# Altium footprint library 3D_MIG_Controller.PCBLIB: 560 footprints (part 31 of 35)
Each footprint in its own frame and in the unit in brackets; x right, y up, seen from the top. Pads: shape width x height; smd on the part's side, far side on the other; paste and mask are expansions set on the pad; w line width, h text height; cw(c..) or ccw(c..) is an arc to the next point about the centre after c.
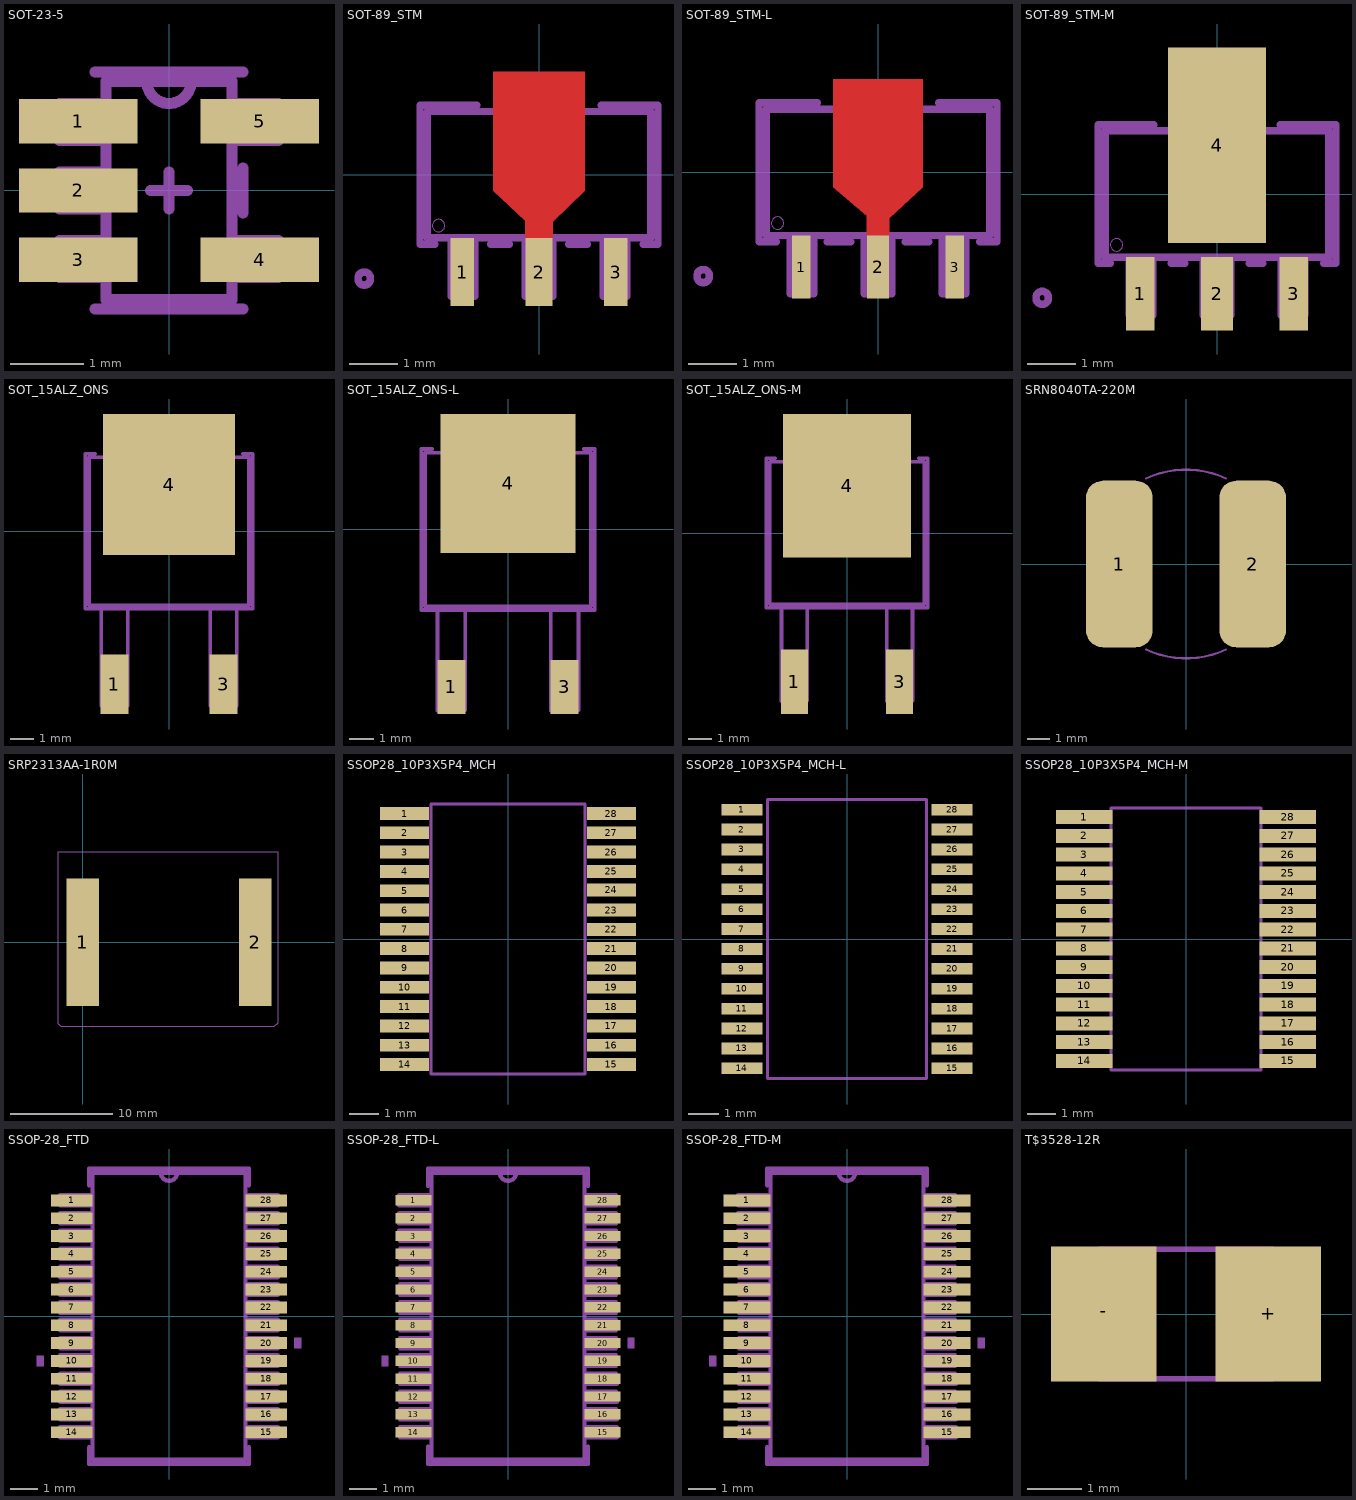
[diagram p30: the footprints below, top view; thin cyan lines are the x and y axes]

## SOT-23-5 [mil]
pads (5):
  rect 64x24 smd: 1(-49,37.4) 2(-49,0) 3(-49,-37.4) 4(49,-37.4) 5(49,37.4)
tDocu:
  lines w6: -34,-47 -34,-59 34,-59 34,-27 ; -34,-47 -34,-27 ; -34,-47 -59,-47 -59,-27 -34,-27 ; -34,-27 -34,-10 ; -34,-10 -34,27 ; -34,-10 -35,10 -59,10 -59,-10 -34,-10 ; -34,27 -34,59 -12,59 ; -34,27 -35,47 -59,47 -59,27 -34,27 ; -12,59 12,59 ; -12,59 ccw(c0,59) 12,59 ; 12,59 34,59 34,47 ; 34,-27 34,27 ; 34,-27 35,-47 59,-47 59,-27 34,-27 ; 34,27 34,47 ; 34,27 59,27 59,47 34,47
  text "*" at -47,18 h62
tPlace:
  lines w6: -40,-64 40,-64 ; -40,64 40,64 ; 40,-12 40,12
  text "*" at -82,56 h62
tOrigins:
  lines w6: -10,0 10,0 ; 0,-10 0,10

## SOT-89_STM [mil]
pads (3):
  rect 19x55 smd: 1(-61.81,-78.5) 3(61.81,-78.5)
  rect 22x55 smd: 2(0,-78.5)
Top:
  region: -11,-51 -11,-37 -37,-13 -37,83 37,83 37,-13 11,-38 11,-51
Top Paste:
  region: -11,-51 -11,-37 -36,-12 -36,77 36,77 36,-12 11,-37 11,-51
Top Solder:
  region: -11,-51 -11,-37 -36,-12 -36,77 36,77 36,-12 11,-37 11,-51
tDocu:
  lines w0: -86,-41 ccw(c-81,-41) -76,-41 ccw(c-81,-41) -86,-41
  lines w6: -90,-51 90,-51 90,51 -90,51 -90,-51 ; -71,-98 -71,-51 -52,-51 -52,-98 -71,-98 ; -11,-98 -11,-51 11,-51 11,-98 -11,-98 ; 52,-98 52,-51 71,-51 71,-98 52,-98
tPlace:
  lines w6: -136,-84 cw(c-141,-84) -146,-84 cw(c-141,-83.5) -136,-83 ; -84,-56 -96,-56 -96,56 -50,56 ; -39,-56 -24,-56 ; 24,-56 39,-56 ; 50,56 96,56 96,-56 84,-56

## SOT-89_STM-L [mil]
pads (3):
  rect 15x51 smd: 1(-61.81,-76.5) 3(61.81,-76.5)
  rect 18x51 smd: 2(0,-76.5)
Top:
  region: -9,-51 -9,-35 -36,-12 -36,75 36,75 36,-12 9,-37 9,-51
Top Paste:
  region: -9,-49 -9,-35 -34,-10 -34,73 34,73 34,-10 9,-35 9,-49
Top Solder:
  region: -9,-49 -9,-35 -34,-10 -34,73 34,73 34,-10 9,-35 9,-49
tDocu:
  lines w0: -86,-41 ccw(c-81,-41) -76,-41 ccw(c-81,-41) -86,-41
  lines w6: -90,-51 90,-51 90,51 -90,51 -90,-51 ; -71,-98 -71,-51 -52,-51 -52,-98 -71,-98 ; -11,-98 -11,-51 11,-51 11,-98 -11,-98 ; 52,-98 52,-51 71,-51 71,-98 52,-98
tPlace:
  lines w6: -136,-84 cw(c-141,-84) -146,-84 cw(c-141,-83.5) -136,-83 ; -82,-56 -96,-56 -96,56 -49,56 ; -41,-56 -22,-56 ; 22,-56 41,-56 ; 49,56 96,56 96,-56 82,-56

## SOT-89_STM-M [mil]
pads (4):
  rect 23x59 smd: 1(-61.81,-80.5) 3(61.81,-80.5)
  rect 26x59 smd: 2(0,-80.5)
  rect 78.74x157.48 smd: 4(0,39.37)
Top Paste:
  region: -13,-53 -13,-39 -38,-14 -38,81 38,81 38,-14 13,-39 13,-53
Top Solder:
  region: -13,-53 -13,-39 -38,-14 -38,81 38,81 38,-14 13,-39 13,-53
tDocu:
  lines w0: -86,-41 ccw(c-81,-41) -76,-41 ccw(c-81,-41) -86,-41
  lines w6: -90,-51 90,-51 90,51 -90,51 -90,-51 ; -71,-98 -71,-51 -52,-51 -52,-98 -71,-98 ; -11,-98 -11,-51 11,-51 11,-98 -11,-98 ; 52,-98 52,-51 71,-51 71,-98 52,-98
tPlace:
  lines w6: -136,-84 cw(c-141,-84) -146,-84 cw(c-141,-83.5) -136,-83 ; -86,-56 -96,-56 -96,56 -51,56 ; -37,-56 -26,-56 ; 26,-56 37,-56 ; 51,56 96,56 96,-56 86,-56

## SOT_15ALZ_ONS [mil]
pads (3):
  rect 46x98 smd: 1(-89.96,-252.5) 3(89.96,-252.5)
  rect 217x233 smd: 4(0,77)
tDocu:
  lines w6: -132,-122 132,-122 132,122 -132,122 -132,-122 ; -112,-288 -112,-122 -68,-122 -68,-288 -112,-288 ; 68,-288 68,-122 112,-122 112,-288 68,-288
  text "*" at -113,-138 h77.5
tPlace:
  lines w6: -122,128 -138,128 -138,-128 138,-128 138,128 122,128 ; -112,-190 -112,-146 ; -68,-190 -68,-146 ; 68,-190 68,-146 ; 112,-190 112,-146
  text "*" at -228,-278 h77.5

## SOT_15ALZ_ONS-L [mil]
pads (3):
  rect 44x86 smd: 1(-89.96,-250.5) 3(89.96,-250.5)
  rect 215x221 smd: 4(0,73)
tDocu:
  lines w6: -132,-122 132,-122 132,122 -132,122 -132,-122 ; -112,-288 -112,-123 -68,-122 -68,-287 -112,-288 ; 68,-288 68,-123 112,-122 112,-287 68,-288
  text "*" at -113,-138 h77.5
tPlace:
  lines w6: -121,128 -138,128 -138,-128 138,-128 138,128 121,128 ; -112,-194 -112,-146 ; -68,-194 -68,-146 ; 68,-194 68,-146 ; 112,-194 112,-146
  text "*" at -228,-276 h77.5

## SOT_15ALZ_ONS-M [mil]
pads (3):
  rect 46x110 smd: 1(-89.96,-254.5) 3(89.96,-254.5)
  rect 219x245 smd: 4(0,81)
tDocu:
  lines w6: -132,-122 132,-122 132,122 -132,122 -132,-122 ; -112,-288 -112,-123 -68,-122 -68,-287 -112,-288 ; 68,-288 68,-123 112,-122 112,-287 68,-288
  text "*" at -113,-138 h77.5
tPlace:
  lines w6: -123,128 -138,128 -138,-128 138,-128 138,128 123,128 ; -112,-186 -112,-146 ; -68,-186 -68,-146 ; 68,-186 68,-146 ; 112,-186 112,-146
  text "*" at -228,-280 h77.5

## SRN8040TA-220M [mm]
pads (2):
  rrect50% 3x7.5 smd: 1(-3,0) 2(3,0)
tPlace:
  lines w0.1: -1.796,3.852 cw(c0,0) 1.796,3.852 ; -1.792,-3.85 ccw(c0.004,0.002) 1.8,-3.85

## SRP2313AA-1R0M [mil]
pads (2):
  rect 124.02x492.13 smd: 1(0,0) 2(666.34,0)
tPlace:
  lines w3.94: -95,-315 -85,-325 740,-325 755,-310 755,350 -95,350 -95,-315

## SSOP28_10P3X5P4_MCH [mil]
pads (28):
  rect 65x17 smd: 1(-137,166.34) 2(-137,140.75) 3(-137,115.16) 4(-137,89.57) 5(-137,63.98) 6(-137,38.39) 7(-137,13) 8(-137,-12.8) 9(-137,-38.39) 10(-137,-63.98) 11(-137,-89.57) 12(-137,-115.16) 13(-137,-140.75) 14(-137,-166.34) 15(137,-166.34) 16(137,-140.75) 17(137,-115.16) 18(137,-89.57) 19(137,-63.98) 20(137,-38.39) 21(137,-12.8) 22(137,12.8) 23(137,38.39) 24(137,65) 25(137,89.57) 26(137,115.16) 27(137,140.75) 28(137,166.34)
tPlace:
  lines w3.94: -102.36,-179.13 -102.36,179.13 102.36,179.13 102.36,-179.13 -102.36,-179.13
  text "*" at -39.27,141.02 h77.5

## SSOP28_10P3X5P4_MCH-L [mil]
pads (28):
  rect 53x15 smd: 1(-135,166.34) 2(-135,140.75) 3(-135,115.16) 4(-135,89.57) 5(-135,63.98) 6(-135,38.39) 7(-135,12.8) 8(-135,-12.8) 9(-135,-38.39) 10(-135,-63.98) 11(-135,-89.57) 12(-135,-115.16) 13(-135,-140.75) 14(-135,-166.34) 15(135,-166.34) 16(135,-140.75) 17(135,-115.16) 18(135,-89.57) 19(135,-63.98) 20(135,-38.39) 21(135,-12.8) 22(135,12.8) 23(135,38.39) 24(135,63.98) 25(135,89.57) 26(135,115.16) 27(135,140.75) 28(135,166.34)
tPlace:
  lines w3.94: -102.36,-179.13 -102.36,179.13 102.36,179.13 102.36,-179.13 -102.36,-179.13
  text "*" at -37.27,135.15 h77.5

## SSOP28_10P3X5P4_MCH-M [mil]
pads (28):
  rect 77x19 smd: 1(-139,166.34) 2(-139,140.75) 3(-139,115.16) 4(-139,89.57) 5(-139,63.98) 6(-139,38.39) 7(-139,12.8) 8(-139,-12.8) 9(-139,-38.39) 10(-139,-63.98) 11(-139,-89.57) 12(-139,-115.16) 13(-139,-140.75) 14(-139,-166.34) 15(139,-166.34) 16(139,-140.75) 17(139,-115.16) 18(139,-89.57) 19(139,-63.98) 20(139,-38.39) 21(139,-12.8) 22(139,12.8) 23(139,38.39) 24(139,63.98) 25(139,89.57) 26(139,115.16) 27(139,140.75) 28(139,166.34)
tPlace:
  lines w3.94: -102.36,-179.13 -102.36,179.13 102.36,179.13 102.36,-179.13 -102.36,-179.13
  text "*" at -35.36,137.06 h77.5

## SSOP-28_FTD [mil]
pads (28):
  rect 59.5x17 smd: 1(-139.75,166.34) 2(-139.75,140.75) 3(-139.75,115.16) 4(-139.75,89.57) 5(-139.75,63.98) 6(-139.75,38.39) 7(-139.75,12.8) 8(-139.75,-12.8) 9(-139.75,-38.39) 10(-139.75,-63.98) 11(-139.75,-89.57) 12(-139.75,-115.16) 13(-139.75,-140.75) 14(-139.75,-166.34) 15(139.75,-166.34) 16(139.75,-140.75) 17(139.75,-115.16) 18(139.75,-89.57) 19(139.75,-63.98) 20(139.75,-38.39) 21(139.75,-12.8) 22(139.75,12.8) 23(139.75,38.39) 24(139.75,63.98) 25(139.75,89.57) 26(139.75,115.16) 27(139.75,140.75) 28(139.75,166.34)
tDocu:
  lines w6: 12,207 cw(c0,206.5) -12,206 ; -12,206 110,206 110,-206 -110,-206 -110,206 -12,206 ; -156,-174 -156,-159 -110,-159 -110,-174 -156,-174 ; -156,-148 -156,-133 -110,-133 -110,-148 -156,-148 ; -156,-123 -156,-108 -110,-108 -110,-123 -156,-123 ; -156,-97 -156,-82 -110,-82 -110,-97 -156,-97 ; -156,-71 -156,-56 -110,-56 -110,-71 -156,-71 ; -156,-46 -156,-31 -110,-31 -110,-46 -156,-46 ; -156,-20 -156,-5 -110,-5 -110,-20 -156,-20 ; -156,5 -156,20 -110,20 -110,5 -156,5 ; -156,31 -156,46 -110,46 -110,31 -156,31 ; -156,56 -156,71 -110,71 -110,56 -156,56 ; -156,82 -156,97 -110,97 -110,82 -156,82 ; -156,108 -156,123 -110,123 -110,108 -156,108 ; -156,133 -156,148 -110,148 -110,133 -156,133 ; -156,159 -156,174 -110,174 -110,159 -156,159 ; 110,-174 110,-159 156,-159 156,-174 110,-174 ; 110,-148 110,-133 156,-133 156,-148 110,-148 ; 110,-123 110,-108 156,-108 156,-123 110,-123 ; 110,-97 110,-82 156,-82 156,-97 110,-97 ; 110,-71 110,-56 156,-56 156,-71 110,-71 ; 110,-46 110,-31 156,-31 156,-46 110,-46 ; 110,-20 110,-5 156,-5 156,-20 110,-20 ; 110,5 110,20 156,20 156,5 110,5 ; 110,31 110,46 156,46 156,31 110,31 ; 110,56 110,71 156,71 156,56 110,56 ; 110,82 110,97 156,97 156,82 110,82 ; 110,108 110,123 156,123 156,108 110,108 ; 110,133 110,148 156,148 156,133 110,133 ; 110,159 110,174 156,174 156,159 110,159
  text "*" at -118,154 h77.5
tPlace:
  region: -189.5,-56.48 -189.5,-71.48 -179.5,-71.48 -179.5,-56.48
  region: 189.5,-30.89 189.5,-45.89 179.5,-45.89 179.5,-30.89
  lines w6: -115,-188 -115,-212 115,-212 115,-188 ; -115,188 -115,212 115,212 115,188
  text "*" at -172,178 h77.5

## SSOP-28_FTD-L [mil]
pads (28):
  rect 51.5x15 smd: 1(-135.75,166.34) 2(-135.75,140.75) 3(-135.75,115.16) 4(-135.75,89.57) 5(-135.75,63.98) 6(-135.75,38.39) 7(-135.75,12.8) 8(-135.75,-12.8) 9(-135.75,-38.39) 10(-135.75,-63.98) 11(-135.75,-89.57) 12(-135.75,-115.16) 13(-135.75,-140.75) 14(-135.75,-166.34) 15(135.75,-166.34) 16(135.75,-140.75) 17(135.75,-115.16) 18(135.75,-89.57) 19(135.75,-63.98) 20(135.75,-38.39) 21(135.75,-12.8) 22(135.75,12.8) 23(135.75,38.39) 24(135.75,63.98) 25(135.75,89.57) 26(135.75,115.16) 27(135.75,140.75) 28(135.75,166.34)
tDocu:
  lines w6: 12,207 cw(c0,206.5) -12,206 ; -12,206 110,206 110,-206 -110,-206 -110,206 -12,206 ; -156,123 -110,123 -110,108 -155,108 -156,123 ; -156,133 -156,148 -110,148 -110,133 -156,133 ; -156,159 -156,174 -110,174 -110,159 -156,159 ; -155,-174 -155,-159 -110,-159 -110,-174 -155,-174 ; -155,-148 -155,-133 -110,-133 -110,-148 -155,-148 ; -155,-123 -155,-108 -110,-108 -110,-123 -155,-123 ; -155,-97 -155,-82 -110,-82 -110,-97 -155,-97 ; -155,-71 -155,-56 -110,-56 -110,-71 -155,-71 ; -155,-46 -155,-31 -110,-31 -110,-46 -155,-46 ; -155,-20 -155,-5 -110,-5 -110,-20 -155,-20 ; -155,5 -155,20 -110,20 -110,5 -155,5 ; -155,31 -155,46 -110,46 -110,31 -155,31 ; -155,56 -155,71 -110,71 -110,56 -155,56 ; -155,82 -155,97 -110,97 -110,82 -155,82 ; 110,-174 110,-159 156,-159 156,-174 110,-174 ; 110,-148 110,-133 155,-133 156,-148 110,-148 ; 110,-123 110,-108 155,-108 156,-123 110,-123 ; 110,-97 110,-82 155,-82 156,-97 110,-97 ; 110,-71 110,-56 155,-56 155,-71 110,-71 ; 110,-46 110,-31 155,-31 155,-46 110,-46 ; 110,-20 110,-5 155,-5 155,-20 110,-20 ; 110,5 110,20 155,20 155,5 110,5 ; 110,31 110,46 155,46 155,31 110,31 ; 110,56 110,71 155,71 155,56 110,56 ; 110,82 110,97 155,97 155,82 110,82 ; 110,108 110,123 155,123 155,108 110,108 ; 110,133 110,148 155,148 155,133 110,133 ; 110,159 110,174 155,174 155,159 110,159
  text "*" at -118,154 h77.5
tPlace:
  region: -181.5,-56.48 -181.5,-71.48 -171.5,-71.48 -171.5,-56.48
  region: 181.5,-30.89 181.5,-45.89 171.5,-45.89 171.5,-30.89
  lines w6: -115,-187 -115,-212 115,-212 115,-187 ; -115,187 -115,212 115,212 115,187
  text "*" at -168,176 h77.5

## SSOP-28_FTD-M [mil]
pads (28):
  rect 67.5x17 smd: 1(-143.75,166.34) 2(-143.75,140.75) 3(-143.75,115.16) 4(-143.75,89.57) 5(-143.75,63.98) 6(-143.75,38.39) 7(-143.75,12.8) 8(-143.75,-12.8) 9(-143.75,-38.39) 10(-143.75,-63.98) 11(-143.75,-89.57) 12(-143.75,-115.16) 13(-143.75,-140.75) 14(-143.75,-166.34) 15(143.75,-166.34) 16(143.75,-140.75) 17(143.75,-115.16) 18(143.75,-89.57) 19(143.75,-63.98) 20(143.75,-38.39) 21(143.75,-12.8) 22(143.75,12.8) 23(143.75,38.39) 24(143.75,63.98) 25(143.75,89.57) 26(143.75,115.16) 27(143.75,140.75) 28(143.75,166.34)
tDocu:
  lines w6: 12,207 cw(c0,206.5) -12,206 ; -12,206 110,206 110,-206 -110,-206 -110,206 -12,206 ; -156,123 -110,123 -110,108 -155,108 -156,123 ; -156,133 -156,148 -110,148 -110,133 -156,133 ; -156,159 -156,174 -110,174 -110,159 -156,159 ; -155,-174 -155,-159 -110,-159 -110,-174 -155,-174 ; -155,-148 -155,-133 -110,-133 -110,-148 -155,-148 ; -155,-123 -155,-108 -110,-108 -110,-123 -155,-123 ; -155,-97 -155,-82 -110,-82 -110,-97 -155,-97 ; -155,-71 -155,-56 -110,-56 -110,-71 -155,-71 ; -155,-46 -155,-31 -110,-31 -110,-46 -155,-46 ; -155,-20 -155,-5 -110,-5 -110,-20 -155,-20 ; -155,5 -155,20 -110,20 -110,5 -155,5 ; -155,31 -155,46 -110,46 -110,31 -155,31 ; -155,56 -155,71 -110,71 -110,56 -155,56 ; -155,82 -155,97 -110,97 -110,82 -155,82 ; 110,-174 110,-159 156,-159 156,-174 110,-174 ; 110,-148 110,-133 155,-133 156,-148 110,-148 ; 110,-123 110,-108 155,-108 156,-123 110,-123 ; 110,-97 110,-82 155,-82 156,-97 110,-97 ; 110,-71 110,-56 155,-56 155,-71 110,-71 ; 110,-46 110,-31 155,-31 155,-46 110,-46 ; 110,-20 110,-5 155,-5 155,-20 110,-20 ; 110,5 110,20 155,20 155,5 110,5 ; 110,31 110,46 155,46 155,31 110,31 ; 110,56 110,71 155,71 155,56 110,56 ; 110,82 110,97 155,97 155,82 110,82 ; 110,108 110,123 155,123 155,108 110,108 ; 110,133 110,148 155,148 155,133 110,133 ; 110,159 110,174 155,174 155,159 110,159
  text "*" at -118,154 h77.5
tPlace:
  region: -197.5,-56.48 -197.5,-71.48 -187.5,-71.48 -187.5,-56.48
  region: 197.5,-30.89 197.5,-45.89 187.5,-45.89 187.5,-30.89
  lines w6: -115,-188 -115,-212 115,-212 115,-188 ; -115,188 -115,212 115,212 115,188
  text "*" at -176,178 h77.5

## T$3528-12R [mm]
pads (2):
  rect 1.95x2.5 smd: +(1.525,0) -(-1.525,0)
tDocu:
  region: -1.75,-0.6 -1.75,0.6 -1.625,0.6 -1.625,-0.6
  region: 1.625,-0.6 1.625,0.6 1.75,0.6 1.75,-0.6
  region: 0.95,-1.225 0.95,1.225 1.25,1.225 1.25,-1.225
  lines w0.102: -1.6,-1.2 1.6,-1.2 1.6,1.2 -1.6,1.2 -1.6,-1.2